# Altium footprint library PCBLIB.PcbLib: 775 footprints (part 18 of 49)
Each footprint in its own frame and in the unit in brackets; x right, y up, seen from the top. Pads: shape width x height; smd on the part's side, far side on the other; paste and mask are expansions set on the pad; w line width, h text height; cw(c..) or ccw(c..) is an arc to the next point about the centre after c.
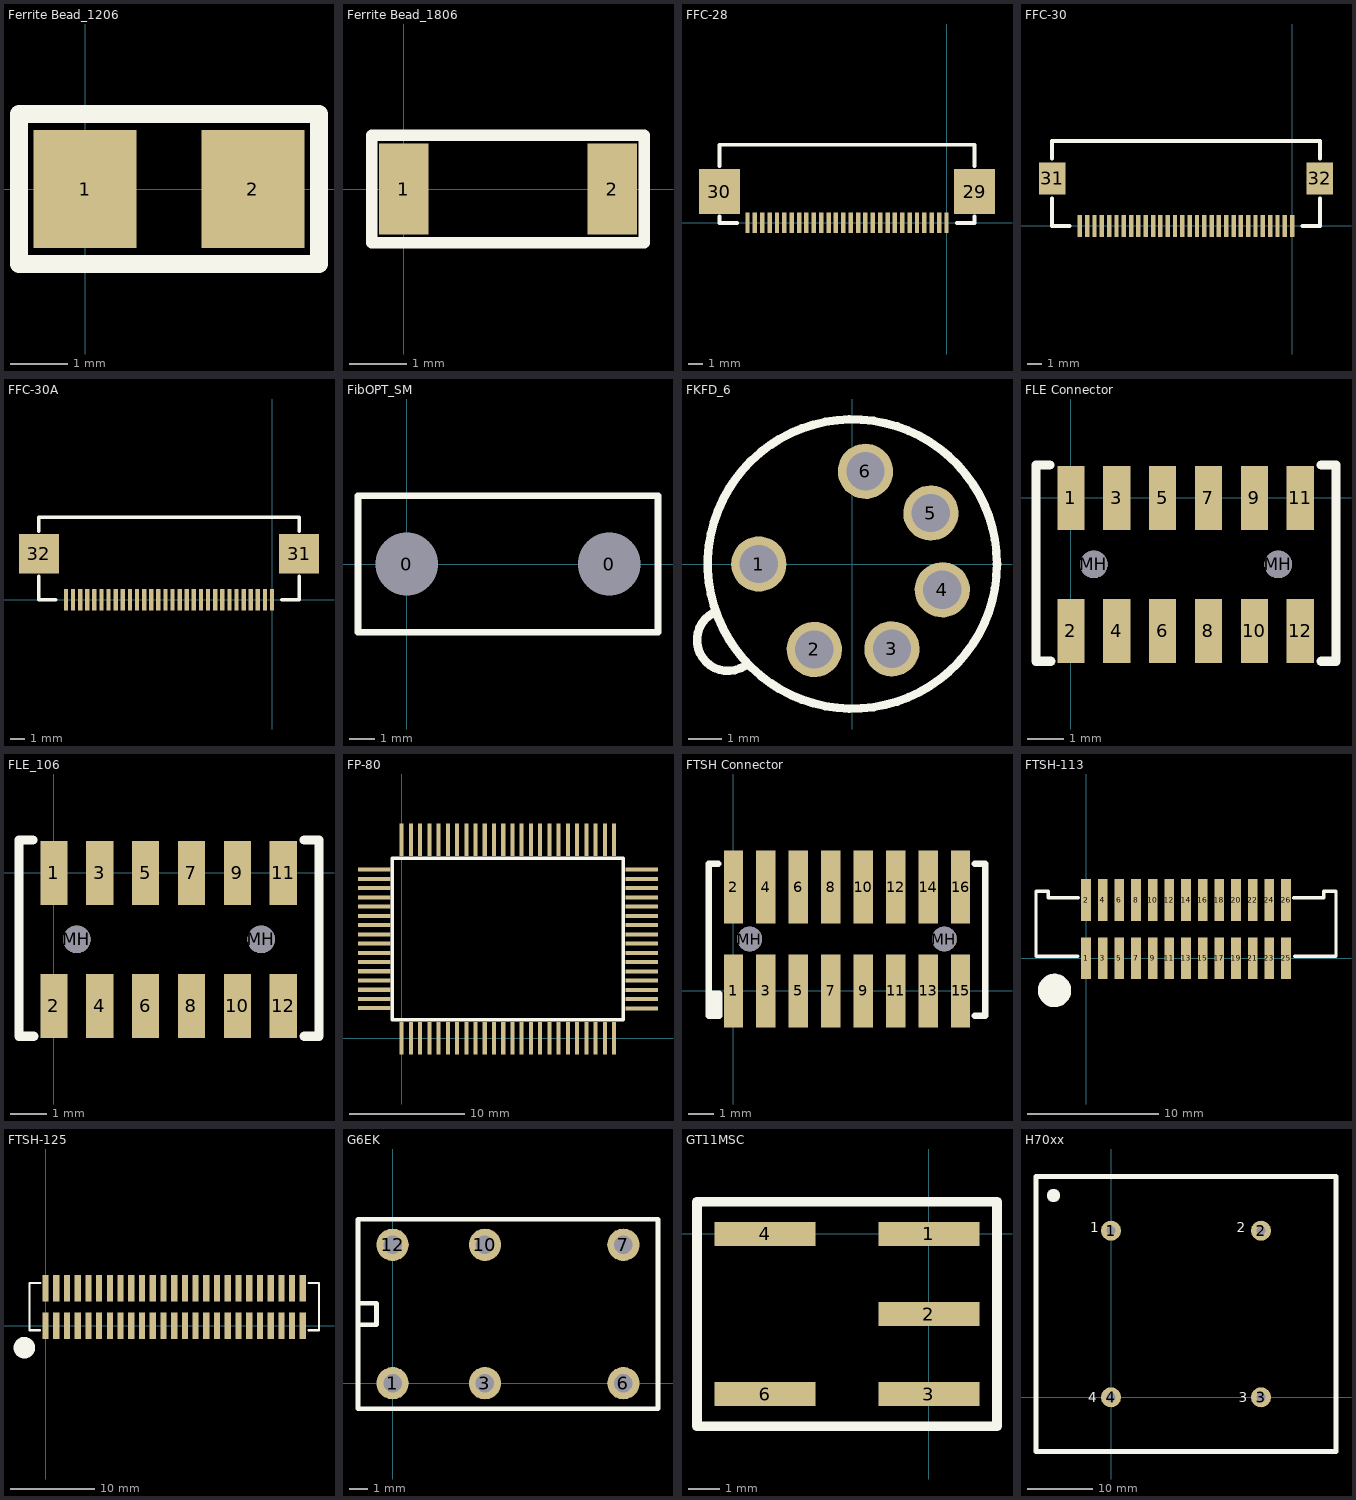
[diagram p17: the footprints below, top view; thin cyan lines are the x and y axes]

## Ferrite Bead_1206 [mil]
pads (2):
  rect 70x80 smd: 1(0,0) 2(114,0)
TopOverlay:
  lines w12: -45,-51 159,-51 159,51 -45,51 -45,-51

## Ferrite Bead_1806 [mil]
height 0.07
pads (2):
  rect 34x63 smd: 1(0,0) 2(144,0)
TopOverlay:
  lines w8: -22,-37 166,-37 166,37 -22,37 -22,-37

## FFC-28 [mm]
pads (30):
  rect 0.3x1.4 smd: 1(0,0) 2(-0.5,0) 3(-1,0) 4(-1.5,0) 5(-2,0) 6(-2.5,0) 7(-3,0) 8(-3.5,0) 9(-4,0) 10(-4.5,0) 11(-5,0) 12(-5.5,0) 13(-6,0) 14(-6.5,0) 15(-7,0) 16(-7.5,0) 17(-8,0) 18(-8.5,0) 19(-9,0) 20(-9.5,0) 21(-10,0) 22(-10.5,0) 23(-11,0) 24(-11.5,0) 25(-12,0) 26(-12.5,0) 27(-13,0) 28(-13.5,0)
  rect 2.794x3.05 smd: 29(1.9,2.125) 30(-15.4,2.125)
TopOverlay:
  lines w0.254: -15.4,3.861 -15.4,5.3 1.9,5.3 1.9,3.861 ; -15.392,0.45 -15.4,0 -14.2,0 ; 0.7,0 1.9,0 1.9,0.45

## FFC-30 [mm]
pads (32):
  rect 0.3x1.5 smd: 1(0,0) 2(-0.5,0) 3(-1,0) 4(-1.5,0) 5(-2,0) 6(-2.5,0) 7(-3,0) 8(-3.5,0) 9(-4,0) 10(-4.5,0) 11(-5,0) 12(-5.5,0) 13(-6,0) 14(-6.5,0) 15(-7,0) 16(-7.5,0) 17(-8,0) 18(-8.5,0) 19(-9,0) 20(-9.5,0) 21(-10,0) 22(-10.5,0) 23(-11,0) 24(-11.5,0) 25(-12,0) 26(-12.5,0) 27(-13,0) 28(-13.5,0) 29(-14,0) 30(-14.5,0)
  rect 1.8x2.2 smd: 31(-16.4,3.25) 32(1.9,3.25)
TopOverlay:
  lines w0.254: -16.408,1.9 -16.408,0 -15.208,0 ; -16.408,4.6 -16.408,5.8 1.9,5.8 1.9,4.6 ; 0.7,0 1.9,0 1.9,1.9

## FFC-30A [mm]
pads (32):
  rect 0.3x1.5 smd: 1(0,0) 2(-0.5,0) 3(-1,0) 4(-1.5,0) 5(-2,0) 6(-2.5,0) 7(-3,0) 8(-3.5,0) 9(-4,0) 10(-4.5,0) 11(-5,0) 12(-5.5,0) 13(-6,0) 14(-6.5,0) 15(-7,0) 16(-7.5,0) 17(-8,0) 18(-8.5,0) 19(-9,0) 20(-9.5,0) 21(-10,0) 22(-10.5,0) 23(-11,0) 24(-11.5,0) 25(-12,0) 26(-12.5,0) 27(-13,0) 28(-13.5,0) 29(-14,0) 30(-14.5,0)
  rect 2.8x2.8 smd: 31(1.9,3.25) 32(-16.4,3.25)
TopOverlay:
  lines w0.254: -16.408,1.676 -16.408,0 -15.208,0 ; -16.408,4.826 -16.408,5.8 1.9,5.8 1.9,4.826 ; 0.7,0 1.9,0 1.9,1.651

## FibOPT_SM [mil]
pads (2):
  round 80 hole 96: 0(0,0) 0(310,0)
TopOverlay:
  lines w10: -75,-105 385,-105 385,105 -75,105 -75,-105

## FKFD_6 [mil]
height 710
pads (6):
  round 65 hole 45: 1(-110,0) 2(-44.74,-100.49) 3(46.49,-99.69) 4(105.74,-30.32) 5(92.25,59.91) 6(15.31,108.93)
TopOverlay:
  circle w10: c0,0 r170
  lines w10: -163.45,-57.43 ccw(c-146.45,-89.43) -127,-120
Mechanical4:
  text "1.370" at 0,0 h1

## FLE Connector [mil] "FLE Surface Mount Connector"
height 78.74
pads (14):
  rect 29.53x70 smd: 1(0,0) 2(0,-145) 3(50,0) 4(50,-145) 5(100,0) 6(100,-145) 7(150,0) 8(150,-145) 9(200,0) 10(200,-145) 11(250,0) 12(250,-145)
  round 30 hole 30 unplated: MH(25,-72.5) MH(226,-72.5)
TopOverlay:
  lines w10: -23,36 -38,36 -38,-178 -22,-178 ; 273,-178 289,-178 289,36 273,36

## FLE_106 [mil]
pads (14):
  rect 29.53x70 smd: 1(0,0) 2(0,-145) 3(50,0) 4(50,-145) 5(100,0) 6(100,-145) 7(150,0) 8(150,-145) 9(200,0) 10(200,-145) 11(250,0) 12(250,-145)
  round 30 hole 30 unplated: MH(25,-72.5) MH(226,-72.5)
TopOverlay:
  lines w10: -23,36 -38,36 -38,-178 -22,-178 ; 273,-178 289,-178 289,36 273,36

## FP-80 [mm]
pads (80):
  rect 0.35x2.8 smd: 1(0,0) 2(0.8,0) 3(1.6,0) 4(2.4,0) 5(3.2,0) 6(4,0) 7(4.8,0) 8(5.6,0) 9(6.4,0) 10(7.2,0) 11(8,0) 12(8.8,0) 13(9.6,0) 14(10.4,0) 15(11.2,0) 16(12,0) 17(12.8,0) 18(13.6,0) 19(14.4,0) 20(15.2,0) 21(16,0) 22(16.8,0) 23(17.6,0) 24(18.4,0) 41(18.4,17.2) 42(17.6,17.2) 43(16.8,17.2) 44(16,17.2) 45(15.2,17.2) 46(14.4,17.2) 47(13.6,17.2) 48(12.8,17.2) 49(12,17.2) 50(11.2,17.2) 51(10.4,17.2) 52(9.6,17.2) 53(8.8,17.2) 54(8,17.2) 55(7.2,17.2) 56(6.4,17.2) 57(5.6,17.2) 58(4.8,17.2) 59(4,17.2) 60(3.2,17.2) 61(2.4,17.2) 62(1.6,17.2) 63(0.8,17.2) 64(0,17.2)
  rect 2.8x0.35 smd: 25(20.8,2.6) 26(20.8,3.4) 27(20.8,4.2) 28(20.8,5) 29(20.8,5.8) 30(20.8,6.6) 31(20.8,7.4) 32(20.8,8.2) 33(20.8,9) 34(20.8,9.8) 35(20.8,10.6) 36(20.8,11.4) 37(20.8,12.2) 38(20.8,13) 39(20.8,13.8) 40(20.8,14.6) 65(-2.375,14.607) 66(-2.375,13.807) 67(-2.375,13.007) 68(-2.375,12.207) 69(-2.375,11.407) 70(-2.375,10.607) 71(-2.375,9.807) 72(-2.375,9.007) 73(-2.375,8.207) 74(-2.375,7.407) 75(-2.375,6.607) 76(-2.375,5.807) 77(-2.375,5.007) 78(-2.375,4.207) 79(-2.375,3.407) 80(-2.375,2.607)
TopOverlay:
  lines w0.305: -0.8,1.6 -0.8,15.6 19.2,15.6 19.2,1.6 -0.8,1.6
  text "." at -1.118,-1.651 h1.52
Mechanical4:
  text ".111" at 0,0 h0.03

## FTSH Connector [mil] "FTSH Surface Mount Connector (Double)"
height 78.74
pads (18):
  rect 29.53x112 smd: 1(0,0) 2(0,160) 3(50,0) 4(50,160) 5(100,0) 6(100,160) 7(150,0) 8(150,160) 9(200,0) 10(200,160) 11(250,0) 12(250,160) 13(300,0) 14(300,160) 15(350,0) 16(350,160)
  round 38 hole 38 unplated: MH(25,80) MH(325,80)
TopOverlay:
  lines w10: -38,-4 -22,-4 -22,-38 -38,-38 -38,196 -23,196 ; -30,-30 -30,-10 ; 372,-38 388,-38 388,196 372,196

## FTSH-113 [mil]
height 210
pads (26):
  rect 29x125 smd: 1(0,0) 2(0,175) 3(50,0) 4(50,175) 5(100,0) 6(100,175) 7(150,0) 8(150,175) 9(200,0) 10(200,175) 11(250,0) 12(250,175) 13(300,0) 14(300,175) 15(350,0) 16(350,175) 17(400,0) 18(400,175) 19(450,0) 20(450,175) 21(500,0) 22(500,175) 23(550,0) 24(550,175) 25(600,0) 26(600,175)
TopOverlay:
  circle w50: c-94.4,-96.32 r25.13
  lines w10: -24.31,6.5 -150,6.5 -150,181.5 -150,201.5 -113,201.5 -113,181.87 -113.37,181.5 -23.41,181.5 -23.19,181.28 ; 622.37,182.18 622.67,181.87 713,181.87 713,201.5 750,201.5 750,181.5 750,6.5 625.53,6.5

## FTSH-125 [mil]
pads (50):
  rect 29x125 smd: 1(0,0) 2(0,175) 3(50,0) 4(50,175) 5(100,0) 6(100,175) 7(150,0) 8(150,175) 9(200,0) 10(200,175) 11(250,0) 12(250,175) 13(300,0) 14(300,175) 15(350,0) 16(350,175) 17(400,0) 18(400,175) 19(450,0) 20(450,175) 21(500,0) 22(500,175) 23(550,0) 24(550,175) 25(600,0) 26(600,175) 27(650,0) 28(650,175) 29(700,0) 30(700,175) 31(750,0) 32(750,175) 33(800,0) 34(800,175) 35(850,0) 36(850,175) 37(900,0) 38(900,175) 39(950,0) 40(950,175) 41(1000,0) 42(1000,175) 43(1050,0) 44(1050,175) 45(1100,0) 46(1100,175) 47(1150,0) 48(1150,175) 49(1200,0) 50(1200,175)
TopOverlay:
  circle w50: c-98.66,-102.35 r25.13
  lines w10: -25.3,-20.74 -75.5,-20.74 -75.5,198.99 -24.58,198.99 ; 1225.7,-20.74 1275.5,-20.74 1275.5,198.99 1225.7,198.99

## G6EK [mil]
pads (6):
  round 70 hole 40: 1(0,0) 3(200,0) 6(500,0) 7(500,300) 10(200,300) 12(0,300)
TopOverlay:
  lines w10: -75,127 -35,127 -35,173 -75,173 ; -75,-55 575,-55 575,355 -75,355 -75,-55

## GT11MSC [mil]
pads (5):
  rect 126x30 smd: 1(0,0) 2(0,-100) 3(0,-200) 4(-204,0) 6(-204,-200)
TopOverlay:
  lines w12: -289,-240 -289,40 85,40 85,-240 -289,-240

## H70xx [mil] "common mode line chokes"
height 1300
pads (5):
  round 120 hole 55: 1(0,1000) 2(900,1000) 3(900,0) 4(0,0)
  round 80 on Top Overlay: ""(-345,1211)
TopOverlay:
  lines w30: -450,-325 1350,-325 1350,1325 -450,1325 -450,-325
  text "1" at -125,990 h60
  text "2" at 755,990 h60
  text "3" at 767,-30 h60
  text "4" at -136,-30 h60